# Altium footprint library Connectors.PcbLib: 155 footprints (part 10 of 10)
Each footprint in its own frame and in the unit in brackets; x right, y up, seen from the top. Pads: shape width x height; smd on the part's side, far side on the other; paste and mask are expansions set on the pad; w line width, h text height; cw(c..) or ccw(c..) is an arc to the next point about the centre after c.
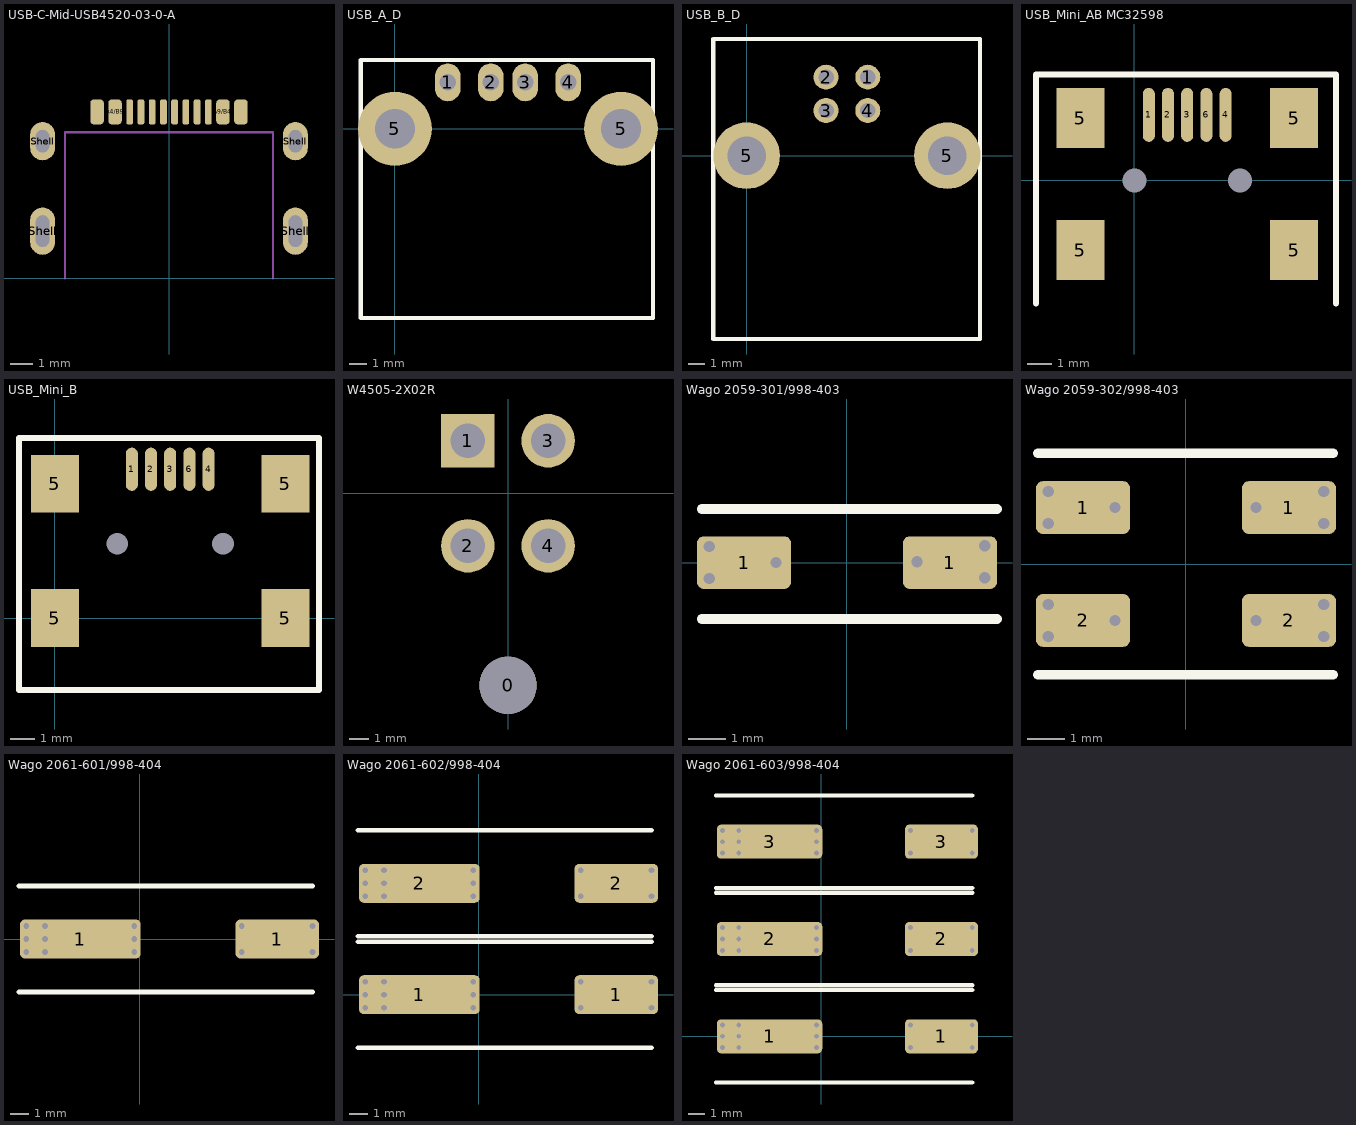
[diagram p9: the footprints below, top view; thin cyan lines are the x and y axes]

## USB-C-Mid-USB4520-03-0-A [mm] "USB4520-03-0-A mid mount, 2.1mm pcb surface to connector bottom"
height 1
pads (20):
  rrect50% 0.6x1.1 smd: A1/B12(-3.2,7.4) A4/B9(-2.4,7.4) A9/B4(2.4,7.4) A12/B1(3.2,7.4)
  rrect50% 0.3x1.1 smd: A5(-1.25,7.4) A6(-0.25,7.4) A7(0.25,7.4) A8(1.25,7.4) B5(1.75,7.4) B6(0.75,7.4) B7(-0.75,7.4) B8(-1.75,7.4)
  oval 1.1x2.1 smd: Shell(-5.62,2.1) Shell(5.62,2.1)
  oval 1.1x2.1 hole 0.6 slot 1.4 at 90 deg: Shell(-5.62,2.1) Shell(5.62,2.1)
  oval 1.1x1.7 smd: Shell(-5.62,6.1) Shell(5.62,6.1)
  oval 1.1x1.7 hole 0.6 slot 1 at 90 deg: Shell(-5.62,6.1) Shell(5.62,6.1)
Mechanical 13:
  lines w0.1: -4.625,0 -4.625,6.5 4.625,6.5 4.625,0
3D body: height 1.06, standoff -2.1, extent -5.77,0 5.77,7.2

## USB_A_D [mm]
pads (6):
  oval 1.5x2.2 hole 0.95: 1(3.07,2.7) 2(5.57,2.7) 3(7.57,2.7) 4(10.07,2.7)
  round 4.3 hole 2.3: 5(0,0) 5(13.14,0)
Top Overlay:
  lines w0.254: -2,-11 15,-11 15,4 -2,4 -2,-11
3D body: height 7.45, standoff -3.47, extent -1.35,-10.4 14.449,3.7

## USB_B_D [mm]
pads (6):
  round 1.5 hole 0.92: 1(7.27,4.71) 2(4.77,4.71) 3(4.77,2.71) 4(7.27,2.71)
  round 4 hole 2.3: 5(0,0) 5(12.05,0)
Top Overlay:
  lines w0.254: -2,-11 14,-11 14,7 -2,7 -2,-11
3D body: height 11, standoff -4.42, extent -1.422,-10.28 13.462,6.72

## USB_Mini_AB MC32598 [mm] "USB Mini AB"
pads (11):
  round 0 hole 1 unplated: 0(0,0) 0(4.4,0)
  oval 0.5x2.25 smd: 1(0.6,2.725) 2(1.4,2.725) 3(2.2,2.725) 4(3.8,2.725) 6(3,2.725)
  rect 2x2.5 smd: 5(-2.25,-2.91) 5(-2.25,2.59) 5(6.65,-2.91) 5(6.65,2.59)
Top Overlay:
  lines w0.254: -4.1,-5.125 -4.1,4.4 8.4,4.4 8.4,-5.125
3D body: height 3.95, standoff -1, extent -3.15,-5.85 7.55,3.35

## USB_Mini_B [mm]
pads (11):
  round 0 hole 0.9: 0(2.6,3.1) 0(7,3.1)
  oval 0.5x1.8 smd: 1(3.2,6.2) 2(4,6.2) 3(4.8,6.2) 4(6.4,6.2) 6(5.6,6.2)
  rect 2x2.4 smd: 5(0,0) 5(0,5.6) 5(9.6,0) 5(9.6,5.6)
Top Overlay:
  lines w0.254: -1.5,-3 -1.5,7.5 11,7.5 11,-3 -1.5,-3
3D body: height 3.95, standoff -1, extent -0.55,-2.8 10.15,6.4

## W4505-2X02R [mm] "W4505-2X02R"
height 9.7
pads (5):
  round 3 hole 3 unplated: 0(0,-10.05)
  rect 2.8x2.8 hole 1.8: 1(-2.1,2.75)
  round 2.8 hole 1.8: 2(-2.1,-2.75) 3(2.1,2.75) 4(2.1,-2.75)
3D body: height 11.4, standoff -3.6, extent -4.8,-16.667 5.2,3.267

## Wago 2059-301/998-403 [mm] "Wago 2059-301/998-403"
height 2.7
pads (2):
  rrect25% 2.5x1.4 smd: 1(-2.725,0) 1(2.75,0)
via 1.875,0.025 diameter 0.5 hole 0.3
via -1.875,0 diameter 0.5 hole 0.3
via 3.675,-0.4 diameter 0.5 hole 0.3
via 3.675,0.45 diameter 0.5 hole 0.3
via -3.65,0.425 diameter 0.5 hole 0.3
via -3.65,-0.425 diameter 0.5 hole 0.3
Top Overlay:
  lines w0.254: -3.85,-1.5 4,-1.5 ; -3.85,1.425 4,1.425
3D body: height 2.7, standoff 0, extent -3.85,-1.5 4,1.4

## Wago 2059-302/998-403 [mm] "Wago 2059-302/998-403"
height 2.7
pads (4):
  rrect25% 2.5x1.4 smd: 1(-2.725,1.5) 1(2.75,1.5) 2(-2.725,-1.5) 2(2.75,-1.5)
via -3.65,-1.925 diameter 0.5 hole 0.3
via -3.65,-1.075 diameter 0.5 hole 0.3
via -3.65,1.075 diameter 0.5 hole 0.3
via -3.65,1.925 diameter 0.5 hole 0.3
via 3.675,1.925 diameter 0.5 hole 0.3
via 3.675,1.075 diameter 0.5 hole 0.3
via 3.675,-1.075 diameter 0.5 hole 0.3
via 3.675,-1.925 diameter 0.5 hole 0.3
via -1.875,1.5 diameter 0.5 hole 0.3
via 1.875,1.5 diameter 0.5 hole 0.3
via 1.875,-1.5 diameter 0.5 hole 0.3
via -1.875,-1.5 diameter 0.5 hole 0.3
Top Overlay:
  lines w0.254: -3.925,-2.95 3.925,-2.95 ; -3.925,2.95 3.925,2.95
3D body: height 2.7, standoff 0, extent -3.925,-2.95 3.925,2.95

## Wago 2061-601/998-404 [mm] "2061-601/998-404"
height 5.6
pads (2):
  rrect25% 6.5x2.1 smd: 1(-3.2,0)
  rrect25% 4.5x2.1 smd: 1(7.4,0)
via -6.1,0.7 diameter 0.5 hole 0.3
via -6.1,-0.7 diameter 0.5 hole 0.3
via -6.1,0 diameter 0.5 hole 0.3
via -5.1,0.7 diameter 0.5 hole 0.3
via -5.1,0 diameter 0.5 hole 0.3
via -5.1,-0.7 diameter 0.5 hole 0.3
via -0.3,0.7 diameter 0.5 hole 0.3
via -0.3,0 diameter 0.5 hole 0.3
via -0.3,-0.7 diameter 0.5 hole 0.3
via 5.5,-0.7 diameter 0.5 hole 0.3
via 5.5,0.7 diameter 0.5 hole 0.3
via 9.3,0.7 diameter 0.5 hole 0.3
via 9.3,-0.7 diameter 0.5 hole 0.3
Top Overlay:
  lines w0.254: -6.5,-2.85 9.3,-2.85 ; -6.5,2.85 9.3,2.85
3D body: height 6.8, standoff 0.05, extent -6.5,-2.85 9.3,2.85

## Wago 2061-602/998-404 [mm] "2061-602/998-404"
height 5.6
pads (4):
  rrect25% 6.5x2.1 smd: 1(-3.2,0) 2(-3.2,6)
  rrect25% 4.5x2.1 smd: 1(7.4,0) 2(7.4,6)
via -6.1,6.7 diameter 0.5 hole 0.3
via -6.1,5.3 diameter 0.5 hole 0.3
via -6.1,6 diameter 0.5 hole 0.3
via -5.1,6.7 diameter 0.5 hole 0.3
via -5.1,6 diameter 0.5 hole 0.3
via -5.1,5.3 diameter 0.5 hole 0.3
via -0.3,6.7 diameter 0.5 hole 0.3
via -0.3,6 diameter 0.5 hole 0.3
via -0.3,5.3 diameter 0.5 hole 0.3
via 5.5,5.3 diameter 0.5 hole 0.3
via 5.5,6.7 diameter 0.5 hole 0.3
via 9.3,6.7 diameter 0.5 hole 0.3
via 9.3,5.3 diameter 0.5 hole 0.3
via 9.3,-0.7 diameter 0.5 hole 0.3
via 9.3,0.7 diameter 0.5 hole 0.3
via 5.5,0.7 diameter 0.5 hole 0.3
via 5.5,-0.7 diameter 0.5 hole 0.3
via -0.3,-0.7 diameter 0.5 hole 0.3
via -0.3,0 diameter 0.5 hole 0.3
via -0.3,0.7 diameter 0.5 hole 0.3
via -5.1,-0.7 diameter 0.5 hole 0.3
via -5.1,0 diameter 0.5 hole 0.3
via -5.1,0.7 diameter 0.5 hole 0.3
via -6.1,0 diameter 0.5 hole 0.3
via -6.1,-0.7 diameter 0.5 hole 0.3
via -6.1,0.7 diameter 0.5 hole 0.3
Top Overlay:
  lines w0.254: -6.5,-2.85 9.3,-2.85 ; -6.5,2.85 9.3,2.85 ; -6.5,3.15 9.3,3.15 ; -6.5,8.85 9.3,8.85
3D body: height 6.8, standoff 0.05, extent -6.5,-2.85 9.3,8.85

## Wago 2061-603/998-404 [mm] "2061-603/998-404"
height 5.6
pads (6):
  rrect25% 6.5x2.1 smd: 1(-3.2,0) 2(-3.2,6) 3(-3.2,12)
  rrect25% 4.5x2.1 smd: 1(7.4,0) 2(7.4,6) 3(7.4,12)
via -6.1,6.7 diameter 0.5 hole 0.3
via -6.1,5.3 diameter 0.5 hole 0.3
via -6.1,6 diameter 0.5 hole 0.3
via -5.1,6.7 diameter 0.5 hole 0.3
via -5.1,6 diameter 0.5 hole 0.3
via -5.1,5.3 diameter 0.5 hole 0.3
via -0.3,6.7 diameter 0.5 hole 0.3
via -0.3,6 diameter 0.5 hole 0.3
via -0.3,5.3 diameter 0.5 hole 0.3
via 5.5,5.3 diameter 0.5 hole 0.3
via 5.5,6.7 diameter 0.5 hole 0.3
via 9.3,6.7 diameter 0.5 hole 0.3
via 9.3,5.3 diameter 0.5 hole 0.3
via 9.3,-0.7 diameter 0.5 hole 0.3
via 9.3,0.7 diameter 0.5 hole 0.3
via 5.5,0.7 diameter 0.5 hole 0.3
via 5.5,-0.7 diameter 0.5 hole 0.3
via -0.3,-0.7 diameter 0.5 hole 0.3
via -0.3,0 diameter 0.5 hole 0.3
via -0.3,0.7 diameter 0.5 hole 0.3
via -5.1,-0.7 diameter 0.5 hole 0.3
via -5.1,0 diameter 0.5 hole 0.3
via -5.1,0.7 diameter 0.5 hole 0.3
via -6.1,0 diameter 0.5 hole 0.3
via -6.1,-0.7 diameter 0.5 hole 0.3
via -6.1,0.7 diameter 0.5 hole 0.3
via -6.1,12.7 diameter 0.5 hole 0.3
via -6.1,11.3 diameter 0.5 hole 0.3
via -6.1,12 diameter 0.5 hole 0.3
via -5.1,12.7 diameter 0.5 hole 0.3
via -5.1,12 diameter 0.5 hole 0.3
via -5.1,11.3 diameter 0.5 hole 0.3
via -0.3,12.7 diameter 0.5 hole 0.3
via -0.3,12 diameter 0.5 hole 0.3
via -0.3,11.3 diameter 0.5 hole 0.3
via 5.5,11.3 diameter 0.5 hole 0.3
via 5.5,12.7 diameter 0.5 hole 0.3
via 9.3,12.7 diameter 0.5 hole 0.3
via 9.3,11.3 diameter 0.5 hole 0.3
Top Overlay:
  lines w0.254: -6.5,-2.85 9.3,-2.85 ; -6.5,2.85 9.3,2.85 ; -6.5,3.15 9.3,3.15 ; -6.5,8.85 9.3,8.85 ; -6.5,9.15 9.3,9.15 ; -6.5,14.85 9.3,14.85
3D body: height 6.8, standoff 0.05, extent -6.5,-2.85 9.3,14.85